# Altium footprint library shkb_lib.PcbLib: 50 footprints (part 2 of 4)
Each footprint in its own frame and in the unit in brackets; x right, y up, seen from the top. Pads: shape width x height; smd on the part's side, far side on the other; paste and mask are expansions set on the pad; w line width, h text height; cw(c..) or ccw(c..) is an arc to the next point about the centre after c.
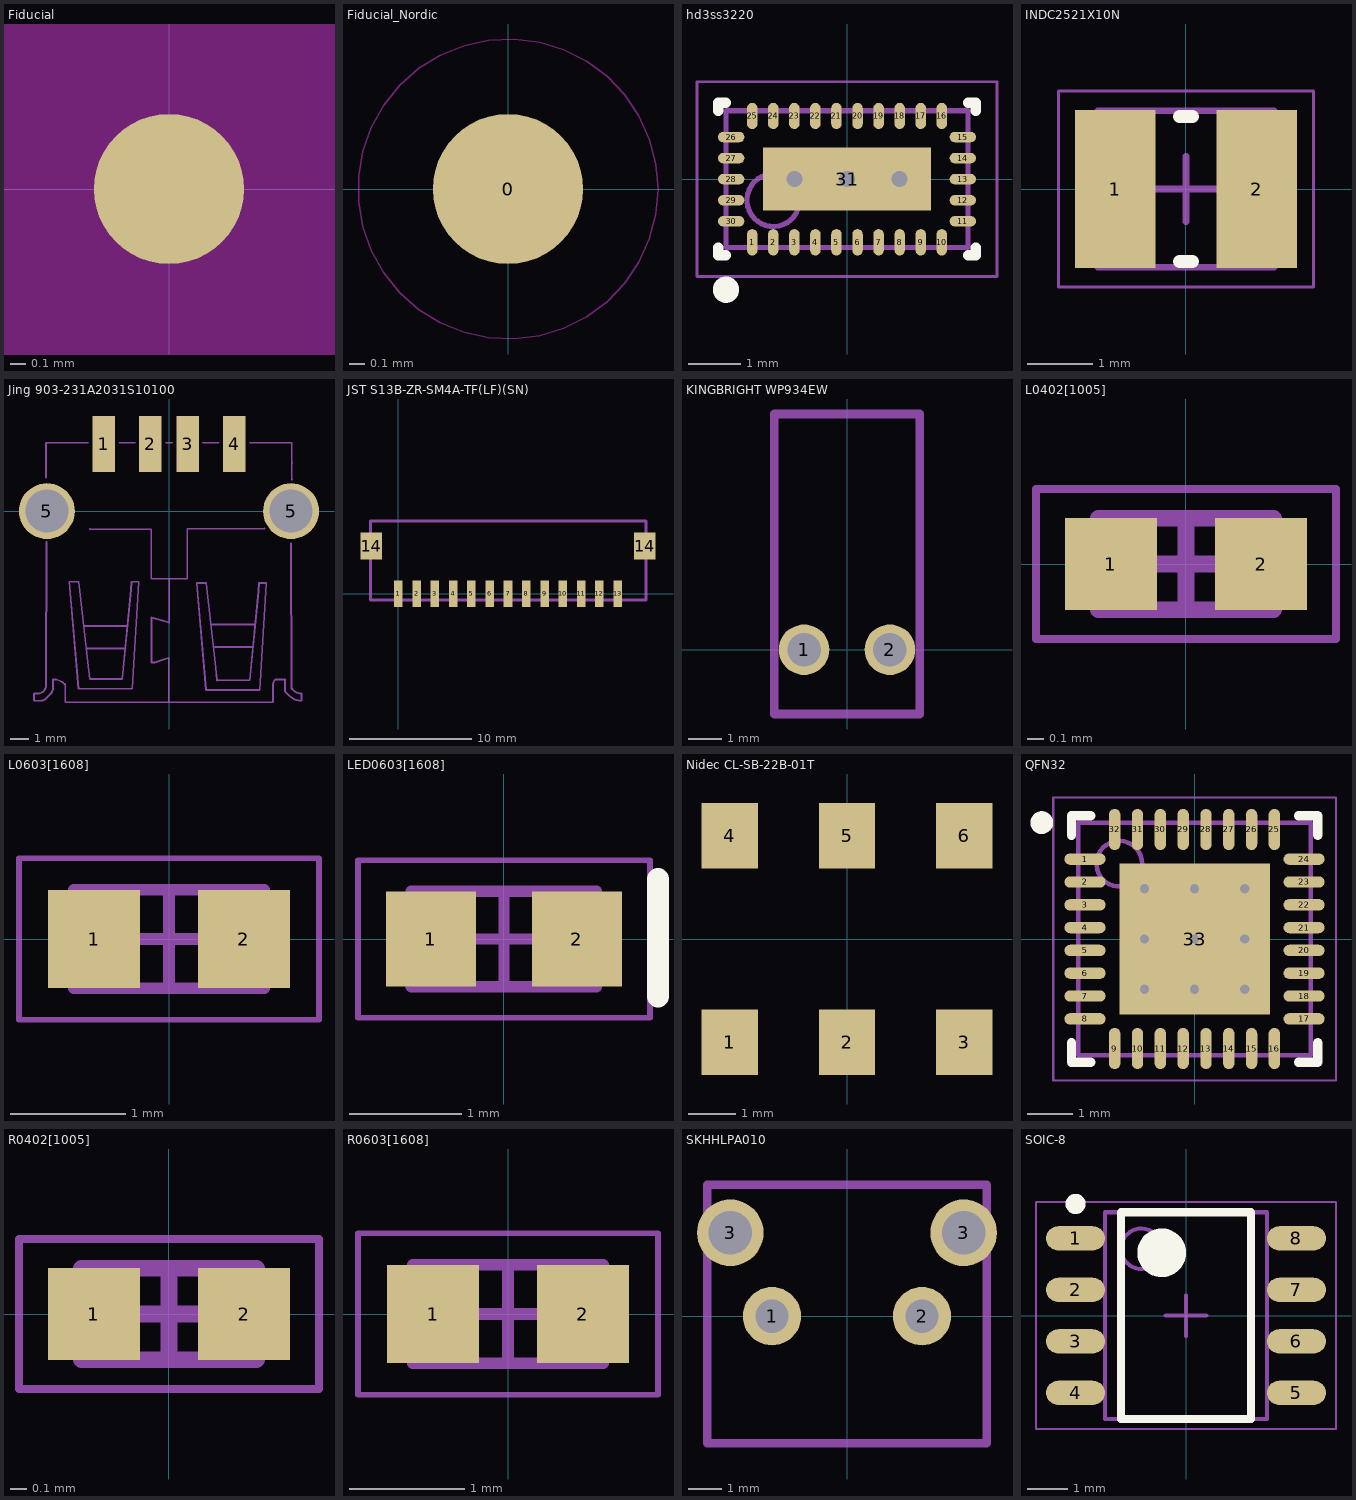
[diagram p1: the footprints below, top view; thin cyan lines are the x and y axes]

## Fiducial [mm]
pads (1):
  round 1 smd mask+0.5: ""(0,0)
Top Layer keep-out:
  circle w1.5: c0,0 r1

## Fiducial_Nordic [mm]
pads (1):
  round 1 smd paste+0 mask+0.5: 0(0,0)
Top Layer keep-out:
  circle w0.01: c0,0 r1

## hd3ss3220 [mm]
height 0.8
pads (31):
  oval 0.2x0.5 smd: 1(-1.8,-1.2) 2(-1.4,-1.2) 3(-1,-1.2) 4(-0.6,-1.2) 5(-0.2,-1.2) 6(0.2,-1.2) 7(0.6,-1.2) 8(1,-1.2) 9(1.4,-1.2) 10(1.8,-1.2) 16(1.8,1.2) 17(1.4,1.2) 18(1,1.2) 19(0.6,1.2) 20(0.2,1.2) 21(-0.2,1.2) 22(-0.6,1.2) 23(-1,1.2) 24(-1.4,1.2) 25(-1.8,1.2)
  oval 0.5x0.2 smd: 11(2.2,-0.8) 12(2.2,-0.4) 13(2.2,0) 14(2.2,0.4) 15(2.2,0.8) 26(-2.2,0.8) 27(-2.2,0.4) 28(-2.2,0) 29(-2.2,-0.4) 30(-2.2,-0.8)
  rect 3.2x1.2 smd paste-1: 31(0,0)
via -1,0 diameter 0.508 hole 0.3
via 0,0 diameter 0.508 hole 0.3
via 1,0 diameter 0.508 hole 0.3
Top Overlay:
  circle w0.25: c-2.3,-2.1 r0.125
  lines w0.2: -2.45,-1.3 -2.45,-1.45 -2.3,-1.45 ; -2.45,1.3 -2.45,1.45 -2.3,1.45 ; 2.3,-1.45 2.45,-1.45 2.45,-1.3 ; 2.3,1.45 2.45,1.45 2.45,1.3
Top Paste:
  region: 0.178,0.584 0.178,-0.584 1.499,-0.584 1.499,0.584
  region: -0.178,-0.584 -0.178,0.584 -1.499,0.584 -1.499,-0.584
Mechanical 13:
  circle w0.1: c-1.4,-0.4 r0.5
  lines w0.1: -2.3,-1.3 2.3,-1.3 2.3,1.3 -2.3,1.3 -2.3,-1.3
  text ".Designator" at -1.88,0.406 h0.5
Mechanical 15:
  lines w0.05: -2.85,-1.85 2.85,-1.85 2.85,1.85 -2.85,1.85 -2.85,-1.85
  lines w0.1: -0.5,0 0.5,0 ; 0,-0.5 0,0.5
3D body "hd3ss3220.step": height 0.8, standoff 0, extent -2.35,-1.35 2.35,1.35

## INDC2521X10N [mm] "Chip Inductor, 2-Leads, Body 2.50x2.10mm, IPC Medium Density"
height 1
pads (2):
  rect 1.23x2.42 smd: 1(-1.085,0) 2(1.085,0)
Top Overlay:
  lines w0.2: -0.1,-1.11 0.1,-1.11 ; -0.1,1.11 0.1,1.11
Mechanical 13:
  lines w0.1: -1.35,-1.2 1.35,-1.2 1.35,1.2 -1.35,1.2 -1.35,-1.2
  text ".Designator" at -0.991,-0.152 h0.5
Mechanical 15:
  lines w0.05: -1.95,-1.5 1.95,-1.5 1.95,1.5 -1.95,1.5 -1.95,-1.5
  lines w0.1: -0.5,0 0.5,0 ; 0,-0.5 0,0.5
3D body "INDC2521X10N.step": height 1, standoff 0, extent -1.35,-1.2 1.35,1.2

## Jing 903-231A2031S10100 [mm] "C42646"
pads (6):
  rect 1.2x3 smd: 1(-3.5,3.592) 2(-1,3.592) 3(1,3.592) 4(3.5,3.592)
  round 3 hole 2.3: 5(-6.55,0) 5(6.55,0)
Mechanical 13:
  circle w0.013: c6.55,0 r0.75
  circle w0.013: c-6.55,0 r0.75
  lines w0.1: -7.193,-0.136 -6.593,-0.136 ; -6.604,1.811 cw(c-6.59,1.825) -6.61,1.825 -6.61,2.612 -6.61,3.364 -6.604,3.364 -6.604,3.667 -4.331,3.667 ; -6.572,-1.662 -6.604,-9.16 -6.604,-9.362 cw(c-7.038,-9.362) -6.731,-9.668 cw(c-7.038,-9.362) -7.038,-9.795 -7.239,-9.795 -7.239,-10.176 -6.858,-10.176 ccw(c-6.858,-9.87) -6.641,-10.087 -6.35,-9.795 ccw(c-6.657,-9.489) -6.223,-9.489 -6.223,-9.033 -6.201,-9.033 cw(c-6.201,-9.901) -5.588,-9.287 cw(c-5.628,-9.327) -5.572,-9.327 -5.572,-10.258 5.572,-10.258 ccw(c5.533,-10.219) 5.588,-10.219 5.588,-9.287 cw(c5.895,-9.287) 5.678,-9.071 5.715,-9.033 6.223,-9.033 6.223,-9.668 6.461,-9.907 ccw(c7.112,-9.257) 7.112,-10.176 7.112,-9.795 cw(c7.112,-9.182) 6.678,-9.616 6.604,-9.541 cw(c6.686,-9.459) 6.57,-9.459 6.543,-1.723 ; -4.513,-6.156 -2.253,-6.156 ; -4.373,-7.366 -2.343,-7.366 ; -4.247,-0.969 -0.95,-0.987 -0.95,-3.628 0.98,-3.628 0.98,-0.949 5.12,-0.926 ; -2.669,3.667 -1.831,3.667 ; -0.169,3.667 0.169,3.667 ; -0.01,-10.207 -0.01,-7.868 -0.38,-7.997 -0.75,-8.118 -0.93,-8.118 -0.93,-5.703 -0.36,-5.868 0.01,-5.988 0.01,-3.678 ; 1.831,3.667 2.669,3.667 ; 2.337,-6.085 4.597,-6.085 ; 2.477,-7.295 4.507,-7.295 ; 4.331,3.667 6.59,3.667 6.59,3.364 6.59,2.614 ; 6.6,-0.138 7.2,-0.138 ; 6.604,1.684 cw(c6.638,1.718) 6.59,1.718 6.59,2.614 ; 6.604,2.58 ccw(c6.556,2.58) 6.59,2.614 ; -5.351,-3.789 -4.842,-3.793 -4.332,-8.333 -4.257,-9.012 -2.507,-9.001 -2.033,-4.223 -2.003,-3.793 -1.623,-3.793 -1.973,-9.536 -4.856,-9.524 -5.351,-3.789 ; 1.488,-3.859 1.997,-3.863 2.507,-8.403 2.583,-9.081 4.332,-9.071 4.806,-4.292 4.836,-3.862 5.217,-3.862 4.867,-9.605 1.983,-9.594 1.488,-3.859
  text ".Designator" at 1.789,0.225 h0.35

## JST S13B-ZR-SM4A-TF(LF)(SN) [mm]
pads (15):
  rect 0.7x2.2 smd: 1(0,0) 2(1.5,0) 3(3,0) 4(4.5,0) 5(6,0) 6(7.5,0) 7(9,0) 8(10.5,0) 9(12,0) 10(13.5,0) 11(15,0) 12(16.5,0) 13(18,0)
  rect 1.75x2.2 smd: 14(-2.2,3.9) 14(20.2,3.9)
Mechanical 13:
  lines w0.254: -2.286,-0.508 -2.286,5.969 20.32,5.969 20.32,-0.508 -2.286,-0.508
  text ".Designator" at 6.35,3.175 h0.5
3D body "S13B-ZR-SM4A-TF.STEP": height 3.7, standoff 0, extent -2.233,-0.531 20.267,5.969

## KINGBRIGHT WP934EW [mm]
height 7.3
pads (2):
  round 1.5 hole 1: 1(-1.27,0) 2(1.27,0)
Mechanical 13:
  lines w0.254: -2.16,-1.905 -2.16,6.985 2.16,6.985 2.16,-1.905 -2.16,-1.905
  text ".Designator" at -0.152,6.198 h0.5
3D body "934EW-1(1).STEP": height 7.35, standoff -3.63, extent -2.16,-1.905 2.16,6.985

## L0402[1005] [mm] "Chip Resistor, 2-Leads, Body 1,00x0,50mm, IPC Medium Density"
height 0.5
pads (2):
  rect 0.55x0.55 smd: 1(-0.45,0) 2(0.45,0)
Mechanical 13:
  lines w0.1: -0.525,-0.275 0.525,-0.275 0.525,0.275 -0.525,0.275 -0.525,-0.275
  text ".Designator" at -0.425,-0.1 h0.2
Mechanical 15:
  lines w0.05: -0.9,-0.45 0.9,-0.45 0.9,0.45 -0.9,0.45 -0.9,-0.45
  lines w0.1: -0.275,0 0.275,0 ; 0,-0.275 0,0.275
3D body: height 0.5, standoff 0, extent -0.325,-0.275 0.325,0.275

## L0603[1608] [mm] "Chip Resistor, 2-Leads, Body 1,57x0,80mm, IPC Medium Density"
height 0.5
pads (2):
  rect 0.8x0.85 smd: 1(-0.65,0) 2(0.65,0)
Mechanical 13:
  lines w0.1: -0.825,-0.425 0.825,-0.425 0.825,0.425 -0.825,0.425 -0.825,-0.425
  text ".Designator" at -1.05,-0.275 h0.35
Mechanical 15:
  lines w0.05: -1.3,-0.7 1.3,-0.7 1.3,0.7 -1.3,0.7 -1.3,-0.7
  lines w0.1: -0.425,0 0.425,0 ; 0,-0.425 0,0.425
3D body: height 0.5, standoff 0, extent -0.525,-0.425 0.525,0.425
3D body: height 0.5, standoff 0, extent 0.525,-0.425 0.825,0.425
3D body: height 0.5, standoff 0, extent -0.825,-0.425 -0.525,0.425

## LED0603[1608] [mm] "Chip Resistor, 2-Leads, Body 1,57x0,80mm, IPC Medium Density"
height 0.5
pads (2):
  rect 0.8x0.85 smd: 1(-0.65,0) 2(0.65,0)
Top Overlay:
  lines w0.2: 1.372,-0.508 1.372,0.533
Mechanical 13:
  lines w0.1: -0.825,-0.425 0.825,-0.425 0.825,0.425 -0.825,0.425 -0.825,-0.425
  text ".Designator" at -1.05,-0.275 h0.35
Mechanical 15:
  lines w0.05: -1.3,-0.7 1.3,-0.7 1.3,0.7 -1.3,0.7 -1.3,-0.7
  lines w0.1: -0.425,0 0.425,0 ; 0,-0.425 0,0.425
3D body "0603 Chip SMD LED (1.6x0.8mm).STEP": height 0.8, standoff 0, extent -0.774,-0.4 0.826,0.4

## Nidec CL-SB-22B-01T [mm]
pads (6):
  rect 1.2x1.4 smd: 1(-2.5,-2.2) 2(0,-2.2) 3(2.5,-2.2) 4(-2.5,2.2) 5(0,2.2) 6(2.5,2.2)
3D body "CL-SB-22B-01T.stp": height 5.5, standoff 0, extent -4.224,-2.449 4.275,2.551

## QFN32 [mm] "From microchip USB3503"
height 1
pads (33):
  oval 0.9x0.25 smd: 1(-2.4,1.75) 2(-2.4,1.25) 3(-2.4,0.75) 4(-2.4,0.25) 5(-2.4,-0.25) 6(-2.4,-0.75) 7(-2.4,-1.25) 8(-2.4,-1.75) 17(2.4,-1.75) 18(2.4,-1.25) 19(2.4,-0.75) 20(2.4,-0.25) 21(2.4,0.25) 22(2.4,0.75) 23(2.4,1.25) 24(2.4,1.75)
  oval 0.25x0.9 smd: 9(-1.75,-2.4) 10(-1.25,-2.4) 11(-0.75,-2.4) 12(-0.25,-2.4) 13(0.25,-2.4) 14(0.75,-2.4) 15(1.25,-2.4) 16(1.75,-2.4) 25(1.75,2.4) 26(1.25,2.4) 27(0.75,2.4) 28(0.25,2.4) 29(-0.25,2.4) 30(-0.75,2.4) 31(-1.25,2.4) 32(-1.75,2.4)
  rect 3.3x3.3 smd: 33(0,0)
via 1.1,-1.1 diameter 0.5 hole 0.2
via 0,-1.1 diameter 0.5 hole 0.2
via -1.1,-1.1 diameter 0.5 hole 0.2
via 1.1,0 diameter 0.5 hole 0.2
via 0,0 diameter 0.5 hole 0.2
via -1.1,0 diameter 0.5 hole 0.2
via 1.1,1.1 diameter 0.5 hole 0.2
via 0,1.1 diameter 0.5 hole 0.2
via -1.1,1.1 diameter 0.5 hole 0.2
Top Overlay:
  circle w0.25: c-3.35,2.55 r0.125
  lines w0.2: -2.7,-2.275 -2.7,-2.7 -2.275,-2.7 ; -2.7,2.275 -2.7,2.7 -2.275,2.7 ; 2.275,-2.7 2.7,-2.7 2.7,-2.275 ; 2.275,2.7 2.7,2.7 2.7,2.275
Mechanical 13:
  circle w0.1: c-1.65,1.65 r0.5
  lines w0.1: -2.55,-2.55 2.55,-2.55 2.55,2.55 -2.55,2.55 -2.55,-2.55
  text ".Designator" at -2.438,-0.381 h0.5
Mechanical 15:
  lines w0.05: -3.1,-3.1 3.1,-3.1 3.1,3.1 -3.1,3.1 -3.1,-3.1
  lines w0.1: -0.5,0 0.5,0 ; 0,-0.5 0,0.5
3D body "QFN32.step": height 1, standoff 0, extent -2.57,-2.57 2.57,2.57

## R0402[1005] [mm] "Chip Resistor, 2-Leads, Body 1,00x0,50mm, IPC Medium Density"
height 0.5
pads (2):
  rect 0.55x0.55 smd: 1(-0.45,0) 2(0.45,0)
Mechanical 13:
  lines w0.1: -0.525,-0.275 -0.525,0.275 0.525,0.275 0.525,-0.275 -0.525,-0.275
  text ".Designator" at -0.425,-0.1 h0.2
Mechanical 15:
  lines w0.05: -0.9,-0.45 -0.9,0.45 0.9,0.45 0.9,-0.45 -0.9,-0.45
  lines w0.1: -0.275,0 0.275,0 ; 0,-0.275 0,0.275
3D body: height 0.5, standoff 0, extent -0.325,-0.275 0.325,0.275

## R0603[1608] [mm] "Chip Resistor, 2-Leads, Body 1,57x0,80mm, IPC Medium Density"
height 0.5
pads (2):
  rect 0.8x0.85 smd: 1(-0.65,0) 2(0.65,0)
Mechanical 13:
  lines w0.1: -0.825,-0.425 0.825,-0.425 0.825,0.425 -0.825,0.425 -0.825,-0.425
  text ".Designator" at -1.05,-0.275 h0.35
Mechanical 15:
  lines w0.05: -1.3,-0.7 1.3,-0.7 1.3,0.7 -1.3,0.7 -1.3,-0.7
  lines w0.1: -0.425,0 0.425,0 ; 0,-0.425 0,0.425
3D body: height 0.5, standoff 0, extent -0.525,-0.425 0.525,0.425
3D body: height 0.5, standoff 0, extent 0.525,-0.425 0.825,0.425
3D body: height 0.5, standoff 0, extent -0.825,-0.425 -0.525,0.425

## SKHHLPA010 [mm]
pads (4):
  round 1.75 hole 1 paste-1 mask-1: 1(-2.25,0) 2(2.25,0)
  round 2 hole 1.3 paste-1 mask-1: 3(-3.5,2.5) 3(3.5,2.5)
Mechanical 13:
  lines w0.254: -4.191,-3.81 -4.191,3.937 4.191,3.937 4.191,-3.81 -4.191,-3.81
  text ".Designator" at 2.286,-1.651 h0.5
3D body "SKHHLP.STEP": height 7.4, standoff -3.5, extent -4.25,-3.858 4.25,4.042

## SOIC-8 [mm] "Based on AT24C256C datasheet"
height 1.75
pads (8):
  oval 1.45x0.6 smd: 1(-2.725,1.905) 2(-2.725,0.635) 3(-2.725,-0.635) 4(-2.725,-1.905) 5(2.725,-1.905) 6(2.725,-0.635) 7(2.725,0.635) 8(2.725,1.905)
Top Overlay:
  circle w0.25: c-2.725,2.755 r0.125
  circle w0.6: c-0.6,1.55 r0.3
  lines w0.2: -1.6,-2.55 -1.6,2.55 1.6,2.55 1.6,-2.55 -1.6,-2.55
Mechanical 13:
  circle w0.1: c-1.1,1.65 r0.5
  lines w0.1: -2,-2.55 -2,2.55 2,2.55 2,-2.55 -2,-2.55
  text ".Designator" at 0.233,1.879 h0.45
Mechanical 15:
  lines w0.05: -3.7,-2.8 -3.7,2.8 3.7,2.8 3.7,-2.8 -3.7,-2.8
  lines w0.1: -0.5,0 0.5,0 ; 0,-0.5 0,0.5
3D body "SOIC-8.step": height 1.75, standoff 0, extent -2.997,-2.55 2.997,2.55